# Altium footprint library WR-TBL_Rising Cage Clamp.PcbLib: 435 footprints (part 8 of 28)
Each footprint in its own frame and in the unit in brackets; x right, y up, seen from the top. Pads: shape width x height; smd on the part's side, far side on the other; paste and mask are expansions set on the pad; w line width, h text height; cw(c..) or ccw(c..) is an arc to the next point about the centre after c.
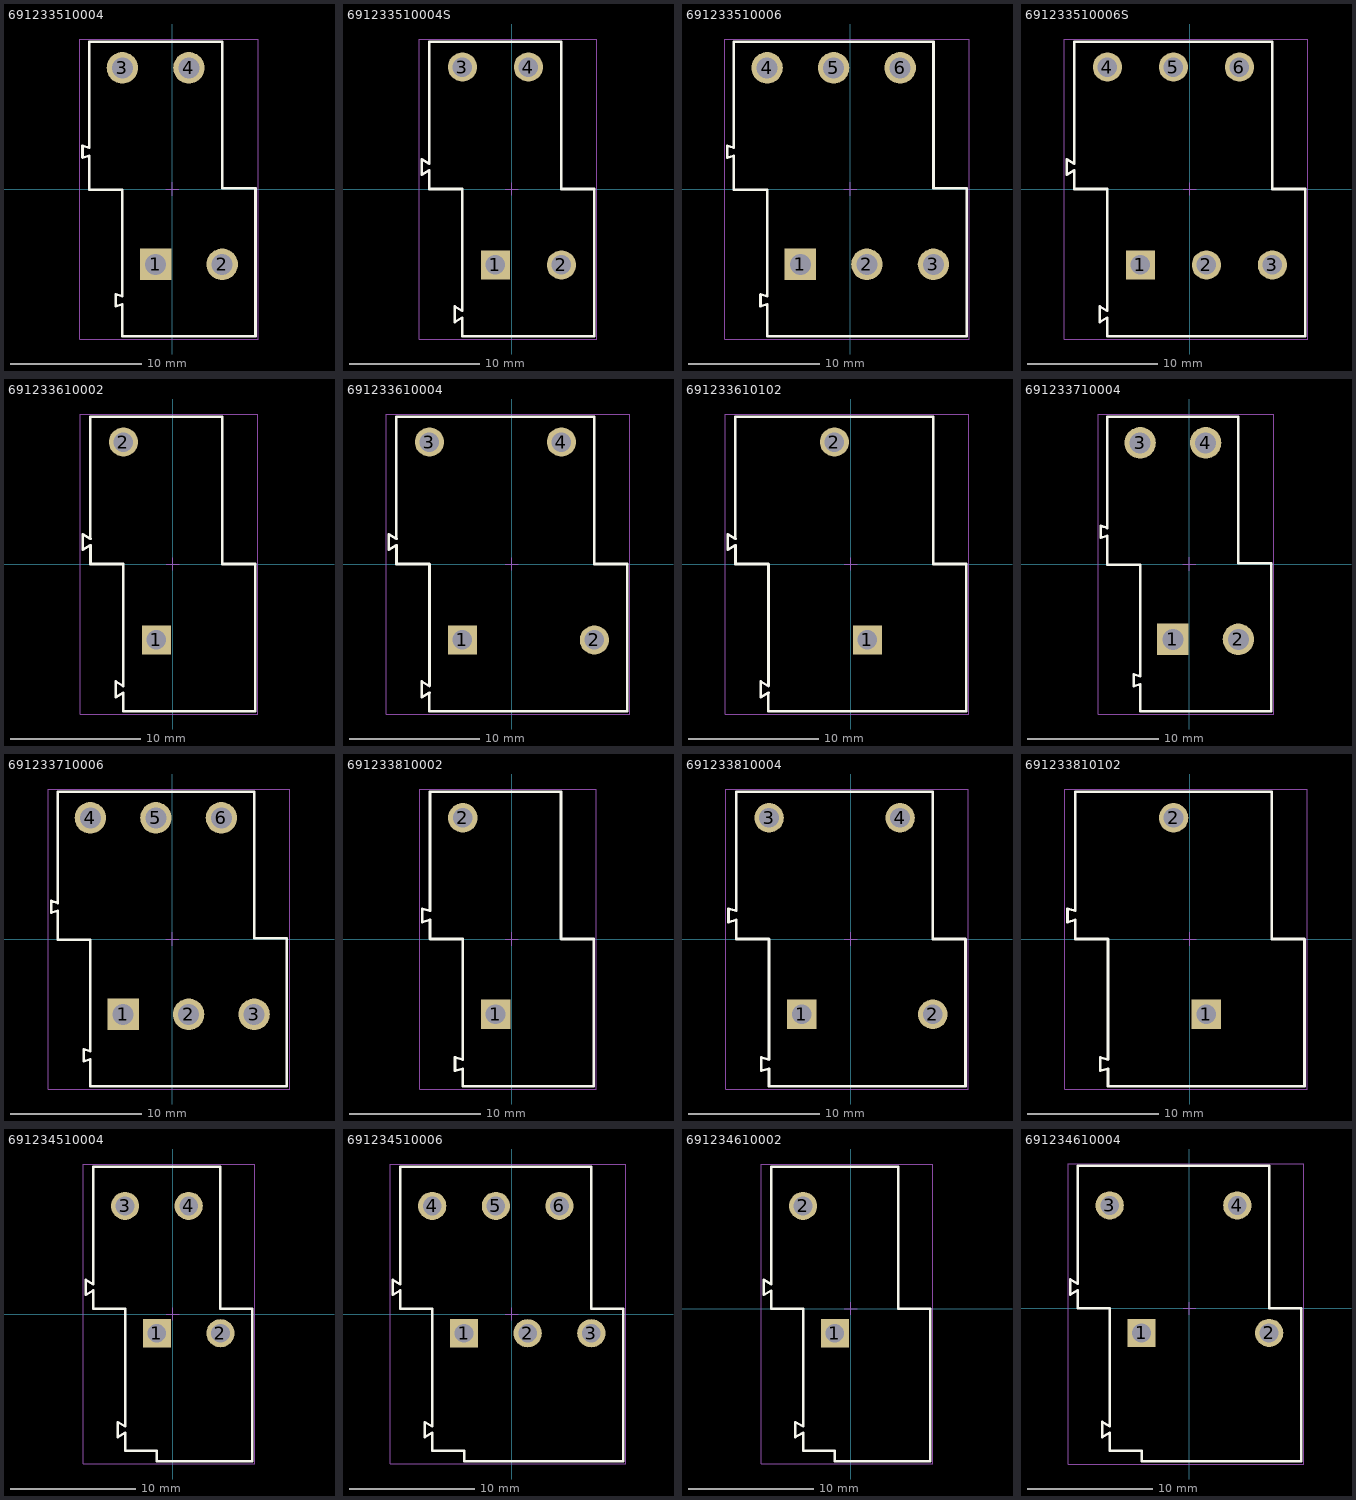
[diagram p7: the footprints below, top view; thin cyan lines are the x and y axes]

## 691233510004 [mm] "5,08mm - modular - 2 rows - Right - horizontal entry with rising cage clamp - 04p - h=31,5mm"
height 31.5
pads (4):
  rect 2.4x2.4 hole 1.6: 1(-1.27,-5.75)
  round 2.4 hole 1.6: 2(3.81,-5.75) 3(-3.81,9.25) 4(1.27,9.25)
Top Overlay:
  lines w0.2: -6.35,2.55 -6.35,-0.05 -3.81,-0.05 ; -6.35,2.551 -6.85,2.4 -6.85,3.3 -6.35,3.149 -6.35,11.25 3.81,11.25 3.81,0.05 6.35,0.05 6.35,-11.25 -3.81,-11.25 -3.81,-8.8 ; -3.81,-8.799 -4.31,-8.95 -4.31,-8.05 -3.81,-8.201 -3.81,-0.05
Mechanical 13:
  lines w0.1: -6.35,2.55 -6.35,-0.05 -3.81,-0.05 ; -6.35,2.551 -6.85,2.4 -6.85,3.3 -6.35,3.149 -6.35,11.25 3.81,11.25 3.81,0.05 6.35,0.05 6.35,-11.25 -3.81,-11.25 -3.81,-8.8 ; -3.81,-8.799 -4.31,-8.95 -4.31,-8.05 -3.81,-8.201 -3.81,-0.05
Mechanical 15:
  lines w0.05: -0.5,0 0.5,0 ; 0,-0.5 0,0.5 ; -7.05,-11.45 6.55,-11.45 6.55,11.45 -7.05,11.45 -7.05,-11.45
3D body "691233510004.stp": height 31.55, standoff -4.95, extent -6.85,-11.25 6.35,11.25

## 691233510004S [mm] "5.08 mm Horizontal Entry with Rising Cage Clamp, 4p"
height 31.5
pads (4):
  rect 2.25x2.25 hole 1.5: 1(-1.27,-5.85)
  round 2.25 hole 1.5: 2(3.81,-5.85) 3(-3.81,9.39) 4(1.27,9.39)
Top Overlay:
  lines w0.2: -6.95,1.095 -6.95,2.295 -6.35,1.95 -6.35,11.35 3.81,11.35 3.81,0 6.35,0 6.35,-11.35 -3.81,-11.35 -3.81,-9.9 -4.41,-10.245 -4.41,-9.045 -3.81,-9.39 -3.81,0 -6.35,0 -6.35,1.44 -6.95,1.095
Mechanical 13:
  lines w0.1: -6.95,1.095 -6.35,1.44 -6.35,0 -3.81,0 -3.81,-9.39 -4.41,-9.045 -4.41,-10.245 -3.81,-9.9 -3.81,-11.35 6.35,-11.35 6.35,0 3.81,0 3.81,11.35 -6.35,11.35 -6.35,1.95 -6.95,2.295 -6.95,1.095
Mechanical 15:
  lines w0.05: -0.5,0 0.5,0 ; 0,-0.5 0,0.5 ; -7.15,-11.55 6.55,-11.55 6.55,11.55 -7.15,11.55 -7.15,-11.55
3D body "691233510004S.stp": height 31.6, standoff -3.9, extent -6.95,-11.35 6.35,11.35

## 691233510006 [mm] "5,08mm - modular - 2 rows - Right - horizontal entry with rising cage clamp - 06p - h=31,5mm"
height 31.5
pads (6):
  rect 2.4x2.4 hole 1.6: 1(-3.81,-5.75)
  round 2.4 hole 1.6: 2(1.27,-5.75) 3(6.35,-5.75) 4(-6.35,9.25) 5(-1.27,9.25) 6(3.81,9.25)
Top Overlay:
  lines w0.2: -8.89,2.55 -8.89,-0.05 -6.35,-0.05 ; -8.89,2.551 -9.39,2.4 -9.39,3.3 -8.89,3.149 -8.89,11.25 6.35,11.25 6.35,0.05 8.89,0.05 8.89,-11.25 -6.35,-11.25 -6.35,-8.8 ; -6.35,-8.799 -6.85,-8.95 -6.85,-8.05 -6.35,-8.201 -6.35,-0.05
Mechanical 13:
  lines w0.1: -8.89,2.55 -8.89,-0.05 -6.35,-0.05 ; -8.89,2.551 -9.39,2.4 -9.39,3.3 -8.89,3.149 -8.89,11.25 6.35,11.25 6.35,0.05 8.89,0.05 8.89,-11.25 -6.35,-11.25 -6.35,-8.8 ; -6.35,-8.799 -6.85,-8.95 -6.85,-8.05 -6.35,-8.201 -6.35,-0.05
Mechanical 15:
  lines w0.05: -0.5,0 0.5,0 ; 0,-0.5 0,0.5 ; -9.59,-11.45 -9.59,11.45 9.09,11.45 9.09,-11.45 -9.59,-11.45
3D body "691233510006.stp": height 31.55, standoff -4.95, extent -9.39,-11.25 8.89,11.25

## 691233510006S [mm] "5.08 mm Horizontal Entry with Rising Cage Clamp, 6p"
height 31.5
pads (6):
  rect 2.25x2.25 hole 1.5: 1(-3.81,-5.85)
  round 2.25 hole 1.5: 2(1.27,-5.85) 3(6.35,-5.85) 4(-6.35,9.39) 5(-1.27,9.39) 6(3.81,9.39)
Top Overlay:
  lines w0.2: -9.49,1.095 -8.89,1.44 -8.89,0 -6.35,0 -6.35,-9.39 -6.95,-9.045 -6.95,-10.245 -6.35,-9.9 -6.35,-11.35 8.89,-11.35 8.89,0 6.35,0 6.35,11.35 -8.89,11.35 -8.89,1.95 -9.49,2.295 -9.49,1.095
Mechanical 13:
  lines w0.1: -9.49,1.095 -9.49,2.295 -8.89,1.95 -8.89,11.35 6.35,11.35 6.35,0 8.89,0 8.89,-11.35 -6.35,-11.35 -6.35,-9.9 -6.95,-10.245 -6.95,-9.045 -6.35,-9.39 -6.35,0 -8.89,0 -8.89,1.44 -9.49,1.095
Mechanical 15:
  lines w0.05: -0.5,0 0.5,0 ; 0,-0.5 0,0.5 ; -9.69,-11.55 -9.69,11.55 9.09,11.55 9.09,-11.55 -9.69,-11.55
3D body "691233510006S.stp": height 31.6, standoff -3.9, extent -9.49,-11.35 8.89,11.35

## 691233610002 [mm] "Horizontal Cable Entry with Rising Cage Clamp, pitch 10.16mm, 02p"
height 31.5
pads (2):
  rect 2.25x2.25 hole 1.5: 1(-1.27,-5.85)
  round 2.25 hole 1.5: 2(-3.81,9.39)
Top Overlay:
  lines w0.2: -6.35,0 -3.81,0 ; -6.35,1.956 -6.35,11.35 3.81,11.35 3.81,0 6.35,0 6.35,-11.35 -3.81,-11.35 -3.81,-9.906 ; -6.348,0.002 -6.348,1.446 -6.95,1.1 -6.95,2.3 -6.348,1.954 ; -3.808,-9.904 -4.41,-10.25 -4.41,-9.05 -3.808,-9.396 -3.808,-0.002
Mechanical 13:
  lines w0.1: -6.35,0 -3.81,0 ; -6.35,1.956 -6.35,11.35 3.81,11.35 3.81,0 6.35,0 6.35,-11.35 -3.81,-11.35 -3.81,-9.906 ; -6.348,0.002 -6.348,1.446 -6.95,1.1 -6.95,2.3 -6.348,1.954 ; -3.808,-9.904 -4.41,-10.25 -4.41,-9.05 -3.808,-9.396 -3.808,-0.002
Mechanical 15:
  lines w0.05: -0.5,0 0.5,0 ; 0,-0.5 0,0.5 ; -7.15,-11.55 6.55,-11.55 6.55,11.55 -7.15,11.55 -7.15,-11.55
3D body "691233610002.stp": height 31.6, standoff -3.9, extent -6.95,-11.35 6.35,11.35

## 691233610004 [mm] "Horizontal Cable Entry with Rising Cage Clamp, pitch 10.16mm, 04p"
height 31.5
pads (4):
  rect 2.25x2.25 hole 1.5: 1(-3.81,-5.85)
  round 2.25 hole 1.5: 2(6.35,-5.85) 3(-6.35,9.39) 4(3.81,9.39)
Top Overlay:
  lines w0.2: -8.89,0 -6.35,0 ; -8.89,1.956 -8.89,11.35 6.35,11.35 6.35,0 8.89,0 8.89,-11.35 -6.35,-11.35 -6.35,-9.906 ; -8.888,0.002 -8.888,1.446 -9.49,1.1 -9.49,2.3 -8.888,1.954 ; -6.348,-9.904 -6.95,-10.25 -6.95,-9.05 -6.348,-9.396 -6.348,-0.002
Mechanical 13:
  lines w0.1: -8.89,0 -6.35,0 ; -8.89,1.956 -8.89,11.35 6.35,11.35 6.35,0 8.89,0 8.89,-11.35 ; -8.888,0.002 -8.888,1.446 -9.49,1.1 -9.49,2.3 -8.888,1.954 ; -6.35,-9.906 -6.35,-11.35 3.81,-11.35 ; -6.348,-9.904 -6.95,-10.25 -6.95,-9.05 -6.348,-9.396 -6.348,-0.002
Mechanical 15:
  lines w0.05: -0.5,0 0.5,0 ; 0,-0.5 0,0.5 ; -9.69,-11.55 9.09,-11.55 9.09,11.55 -9.69,11.55 -9.69,-11.55
3D body "691233610004.stp": height 31.6, standoff -3.9, extent -9.49,-11.35 8.89,11.35

## 691233610102 [mm] "Horizontal Cable Entry with Rising Cage Clamp, pitch 10.16mm, 02p"
height 31.5
pads (2):
  rect 2.25x2.25 hole 1.5: 1(1.27,-5.85)
  round 2.25 hole 1.5: 2(-1.27,9.39)
Top Overlay:
  lines w0.2: -8.89,0 -6.35,0 ; -8.89,1.956 -8.89,11.35 6.35,11.35 6.35,0 8.89,0 8.89,-11.35 -6.35,-11.35 -6.35,-9.906 ; -8.888,0.002 -8.888,1.446 -9.49,1.1 -9.49,2.3 -8.888,1.954 ; -6.348,-9.904 -6.95,-10.25 -6.95,-9.05 -6.348,-9.396 -6.348,-0.002
Mechanical 13:
  lines w0.1: -8.89,0 -6.35,0 ; -8.89,1.956 -8.89,11.35 6.35,11.35 6.35,0 8.89,0 8.89,-11.35 ; -8.888,0.002 -8.888,1.446 -9.49,1.1 -9.49,2.3 -8.888,1.954 ; -6.35,-9.906 -6.35,-11.35 3.81,-11.35 ; -6.348,-9.904 -6.95,-10.25 -6.95,-9.05 -6.348,-9.396 -6.348,-0.002
Mechanical 15:
  lines w0.05: -0.5,0 0.5,0 ; 0,-0.5 0,0.5 ; -9.69,-11.55 9.09,-11.55 9.09,11.55 -9.69,11.55 -9.69,-11.55
3D body "691233610102.stp": height 31.6, standoff -3.9, extent -9.49,-11.35 8.89,11.35

## 691233710004 [mm] "5,00mm - modular - 2 rows - Right - horizontal entry with rising cage clamp - 04p - h=31,5mm"
height 31.5
pads (4):
  rect 2.4x2.4 hole 1.6: 1(-1.25,-5.75)
  round 2.4 hole 1.6: 2(3.75,-5.75) 3(-3.75,9.25) 4(1.25,9.25)
Top Overlay:
  lines w0.2: -6.75,2 -6.25,2.15 -6.25,-0.05 -3.75,-0.05 -3.75,-8.57 -4.25,-8.42 -4.25,-9.32 -3.75,-9.17 -3.75,-11.25 6.25,-11.25 6.25,0.05 3.75,0.05 3.75,11.25 -6.25,11.25 -6.25,2.75 -6.75,2.9 -6.75,2
Mechanical 13:
  lines w0.1: -6.75,2 -6.75,2.9 -6.25,2.75 -6.25,11.25 3.75,11.25 3.75,0.05 6.25,0.05 6.25,-11.25 -3.75,-11.25 -3.75,-9.17 -4.25,-9.32 -4.25,-8.42 -3.75,-8.57 -3.75,-0.05 -6.25,-0.05 -6.25,2.15 -6.75,2
Mechanical 15:
  lines w0.05: -0.5,0 0.5,0 ; 0,-0.5 0,0.5 ; -6.95,-11.45 6.45,-11.45 6.45,11.45 -6.95,11.45 -6.95,-11.45
3D body "691233710004.stp": height 31.55, standoff -4.95, extent -6.75,-11.25 6.25,11.25

## 691233710006 [mm] "5,00mm - modular - 2 rows - Right - horizontal entry with rising cage clamp - 06p - h=31,5mm"
height 31.5
pads (6):
  rect 2.4x2.4 hole 1.6: 1(-3.75,-5.75)
  round 2.4 hole 1.6: 2(1.25,-5.75) 3(6.25,-5.75) 4(-6.25,9.25) 5(-1.25,9.25) 6(3.75,9.25)
Top Overlay:
  lines w0.2: -9.25,2 -9.25,2.9 -8.75,2.75 -8.75,11.25 6.25,11.25 6.25,0.05 8.75,0.05 8.75,-11.25 -6.25,-11.25 -6.25,-9.17 -6.75,-9.32 -6.75,-8.42 -6.25,-8.57 -6.25,-0.05 -8.75,-0.05 -8.75,2.15 -9.25,2
Mechanical 13:
  lines w0.1: -9.25,2 -8.75,2.15 -8.75,-0.05 -6.25,-0.05 -6.25,-8.57 -6.75,-8.42 -6.75,-9.32 -6.25,-9.17 -6.25,-11.25 8.75,-11.25 8.75,0.05 6.25,0.05 6.25,11.25 -8.75,11.25 -8.75,2.75 -9.25,2.9 -9.25,2
Mechanical 15:
  lines w0.05: -0.5,0 0.5,0 ; 0,-0.5 0,0.5 ; -9.45,-11.45 -9.45,11.45 8.95,11.45 8.95,-11.45 -9.45,-11.45
3D body "691233710006.stp": height 31.55, standoff -4.95, extent -9.25,-11.25 8.75,11.25

## 691233810002 [mm] "Serie 2338 - 10.00 mm Horizontal Entry w. Rising Cage Clamp, 02p"
height 31.5
pads (2):
  rect 2.25x2.25 hole 1.5: 1(-1.25,-5.75)
  round 2.25 hole 1.5: 2(-3.75,9.25)
Top Overlay:
  lines w0.2: -3.75,-9.89 -4.35,-10.06 -4.35,-9.03 -3.75,-9.2 -3.75,0 -6.25,0 -6.25,1.46 -6.85,1.29 -6.85,2.32 -6.25,2.149 -6.25,11.25 3.75,11.25 3.75,0 6.25,0 6.25,-11.25 -3.75,-11.25 -3.75,-9.89
Mechanical 13:
  lines w0.1: -3.75,-9.89 -4.35,-10.06 -4.35,-9.03 -3.75,-9.2 -3.75,0 -6.25,0 -6.25,1.46 -6.85,1.29 -6.85,2.32 -6.25,2.149 -6.25,11.25 3.75,11.25 3.75,0 6.25,0 6.25,-11.25 -3.75,-11.25 -3.75,-9.89
Mechanical 15:
  lines w0.05: -0.5,0 0.5,0 ; 0,-0.5 0,0.5 ; -7.05,-11.45 6.45,-11.45 6.45,11.45 -7.05,11.45 -7.05,-11.45
3D body "691233810002.stp": height 31.7, standoff -3.8, extent -6.85,-11.25 6.25,11.25

## 691233810004 [mm] "Serie 2338 - 10.00 mm Horizontal Entry w. Rising Cage Clamp, 04p"
height 31.5
pads (4):
  rect 2.25x2.25 hole 1.5: 1(-3.75,-5.75)
  round 2.25 hole 1.5: 2(6.25,-5.75) 3(-6.25,9.25) 4(3.75,9.25)
Top Overlay:
  lines w0.2: -6.25,-9.89 -6.85,-10.06 -6.85,-9.03 -6.25,-9.2 -6.25,0 -8.75,0 -8.75,1.46 -9.35,1.29 -9.35,2.32 -8.75,2.149 -8.75,11.25 6.25,11.25 6.25,0 8.75,0 8.75,-11.25 -6.25,-11.25 -6.25,-9.89
Mechanical 13:
  lines w0.1: -6.25,-9.89 -6.85,-10.06 -6.85,-9.03 -6.25,-9.2 -6.25,0 -8.75,0 -8.75,1.46 -9.35,1.29 -9.35,2.32 -8.75,2.149 -8.75,11.25 6.25,11.25 6.25,0 8.75,0 8.75,-11.25 ; -6.25,-9.89 -6.25,-11.25 3.75,-11.25
Mechanical 15:
  lines w0.05: -0.5,0 0.5,0 ; 0,-0.5 0,0.5 ; -9.55,-11.45 8.95,-11.45 8.95,11.45 -9.55,11.45 -9.55,-11.45
3D body "691233810004.stp": height 31.7, standoff -3.8, extent -9.35,-11.25 8.75,11.25

## 691233810102 [mm] "Serie 2338 - 10.00 mm Horizontal Entry w. Rising Cage Clamp, 02p"
height 31.5
pads (2):
  rect 2.25x2.25 hole 1.5: 1(1.25,-5.75)
  round 2.25 hole 1.5: 2(-1.25,9.25)
Top Overlay:
  lines w0.2: -6.25,-9.89 -6.85,-10.06 -6.85,-9.03 -6.25,-9.2 -6.25,0 -8.75,0 -8.75,1.46 -9.35,1.29 -9.35,2.32 -8.75,2.149 -8.75,11.25 6.25,11.25 6.25,0 8.75,0 8.75,-11.25 -6.25,-11.25 -6.25,-9.89
Mechanical 13:
  lines w0.1: -6.25,-9.89 -6.85,-10.06 -6.85,-9.03 -6.25,-9.2 -6.25,0 -8.75,0 -8.75,1.46 -9.35,1.29 -9.35,2.32 -8.75,2.149 -8.75,11.25 6.25,11.25 6.25,0 8.75,0 8.75,-11.25 ; -6.25,-9.89 -6.25,-11.25 3.75,-11.25
Mechanical 15:
  lines w0.05: -0.5,0 0.5,0 ; 0,-0.5 0,0.5 ; -9.55,-11.45 8.95,-11.45 8.95,11.45 -9.55,11.45 -9.55,-11.45
3D body "691233810102.stp": height 31.7, standoff -3.8, extent -9.35,-11.25 8.75,11.25

## 691234510004 [mm] "Horizontal Cable Entry with Rising Cage Clamp, pitch 5.08mm, 04p"
height 45
pads (4):
  rect 2.25x2.25 hole 1.5: 1(-1.27,-1.535)
  round 2.25 hole 1.5: 2(3.81,-1.535) 3(-3.81,8.625) 4(1.27,8.625)
Top Overlay:
  lines w0.2: -6.351,1.877 -6.95,1.525 -6.95,2.725 -6.351,2.373 -6.351,11.774 ; -6.35,1.875 -6.35,0.425 -3.81,0.425 ; -6.35,11.775 3.81,11.775 3.81,0.425 6.35,0.425 6.35,-11.775 -1.27,-11.775 -1.27,-10.925 -3.81,-10.925 ; -3.811,-10.924 -3.811,-9.473 -4.41,-9.825 -4.41,-8.625 -3.811,-8.977 -3.811,0.424
Mechanical 13:
  lines w0.1: -6.351,1.877 -6.95,1.525 -6.95,2.725 -6.351,2.373 -6.351,11.774 ; -6.35,1.875 -6.35,0.425 -3.81,0.425 ; -6.35,11.775 3.81,11.775 3.81,0.425 6.35,0.425 6.35,-11.775 -1.27,-11.775 -1.27,-10.925 -3.81,-10.925 ; -3.811,-10.924 -3.811,-9.473 -4.41,-9.825 -4.41,-8.625 -3.811,-8.977 -3.811,0.424
Mechanical 15:
  lines w0.05: -0.5,0 0.5,0 ; 0,-0.5 0,0.5 ; -7.15,-11.975 -7.15,11.975 6.55,11.975 6.55,-11.975 -7.15,-11.975
3D body "691234510004.stp": height 45.1, standoff -3.9, extent -6.95,-11.775 6.35,11.775

## 691234510006 [mm] "Horizontal Cable Entry with Rising Cage Clamp, pitch 5.08mm, 06p"
height 45
pads (6):
  rect 2.25x2.25 hole 1.5: 1(-3.81,-1.535)
  round 2.25 hole 1.5: 2(1.27,-1.535) 3(6.35,-1.535) 4(-6.35,8.625) 5(-1.27,8.625) 6(3.81,8.625)
Top Overlay:
  lines w0.2: -8.891,1.877 -9.49,1.525 -9.49,2.725 -8.891,2.373 -8.891,11.774 ; -8.89,1.875 -8.89,0.425 -6.35,0.425 ; -8.89,11.775 6.35,11.775 6.35,0.425 8.89,0.425 8.89,-11.775 -3.81,-11.775 -3.81,-10.925 -6.35,-10.925 ; -6.351,-10.924 -6.351,-9.473 -6.95,-9.825 -6.95,-8.625 -6.351,-8.977 -6.351,0.424
Mechanical 13:
  lines w0.1: -8.891,1.877 -9.49,1.525 -9.49,2.725 -8.891,2.373 -8.891,11.774 ; -8.89,1.875 -8.89,0.425 -6.35,0.425 ; -8.89,11.775 6.35,11.775 6.35,0.425 8.89,0.425 8.89,-11.775 -3.81,-11.775 -3.81,-10.925 -6.35,-10.925 ; -6.351,-10.924 -6.351,-9.473 -6.95,-9.825 -6.95,-8.625 -6.351,-8.977 -6.351,0.424
Mechanical 15:
  lines w0.05: -0.5,0 0.5,0 ; 0,-0.5 0,0.5 ; -9.69,-11.975 9.09,-11.975 9.09,11.975 -9.69,11.975 -9.69,-11.975
3D body "691234510006.stp": height 45.1, standoff -3.9, extent -9.49,-11.775 8.89,11.775

## 691234610002 [mm] "Horizontal Cable Entry with Rising Cage Clamp, pitch 10.16mm, 02p"
height 45
pads (2):
  rect 2.25x2.25 hole 1.5: 1(-1.27,-1.96)
  round 2.25 hole 1.5: 2(-3.81,8.2)
Top Overlay:
  lines w0.2: -6.952,1.1 -6.952,2.3 -6.35,1.954 -6.35,11.35 3.81,11.35 3.81,0 6.35,0 6.35,-12.2 -1.27,-12.2 -1.27,-11.35 -3.81,-11.35 -3.81,-9.904 -4.412,-10.25 -4.412,-9.05 -3.81,-9.396 -3.81,0 -6.35,0 -6.35,1.446 -6.952,1.1
Mechanical 13:
  lines w0.1: -6.952,1.1 -6.35,1.446 -6.35,0 -3.81,0 -3.81,-9.396 -4.412,-9.05 -4.412,-10.25 -3.81,-9.904 -3.81,-11.35 -1.27,-11.35 -1.27,-12.2 6.35,-12.2 6.35,0 3.81,0 3.81,11.35 -6.35,11.35 -6.35,1.954 -6.952,2.3 -6.952,1.1
Mechanical 15:
  lines w0.05: -0.5,0 0.5,0 ; 0,-0.5 0,0.5 ; -7.15,-12.4 6.55,-12.4 6.55,11.55 -7.15,11.55 -7.15,-12.4
3D body "691234610002.stp": height 45.1, standoff -3.9, extent -6.95,-12.2 6.35,11.35

## 691234610004 [mm] "Horizontal Cable Entry with Rising Cage Clamp, pitch 10.16mm, 04p"
height 45
pads (4):
  rect 2.25x2.25 hole 1.5: 1(-3.81,-1.96)
  round 2.25 hole 1.5: 2(6.35,-1.96) 3(-6.35,8.2) 4(3.81,8.2)
Top Overlay:
  lines w0.2: -9.492,1.1 -8.89,1.446 -8.89,0 -6.35,0 -6.35,-9.396 -6.952,-9.05 -6.952,-10.25 -6.35,-9.904 -6.35,-11.35 -3.81,-11.35 -3.81,-12.2 8.89,-12.2 8.89,0 6.35,0 6.35,11.35 -8.89,11.35 -8.89,1.954 -9.492,2.3 -9.492,1.1
Mechanical 13:
  lines w0.1: -9.492,1.1 -9.492,2.3 -8.89,1.954 -8.89,11.35 6.35,11.35 6.35,0 8.89,0 8.89,-12.2 -3.81,-12.2 -3.81,-11.35 -6.35,-11.35 -6.35,-9.904 -6.952,-10.25 -6.952,-9.05 -6.35,-9.396 -6.35,0 -8.89,0 -8.89,1.446 -9.492,1.1
Mechanical 15:
  lines w0.05: -0.5,0 0.5,0 ; 0,-0.5 0,0.5 ; -9.64,-12.4 -9.64,11.5 9.09,11.5 9.09,-12.4 -9.64,-12.4
3D body "691234610004.stp": height 45.1, standoff -3.9, extent -9.49,-12.2 8.89,11.35